# Altium footprint library 1.27插件排针.PcbLib: 49 footprints (part 1 of 4)
Each footprint in its own frame and in the unit in brackets; x right, y up, seen from the top. Pads: shape width x height; smd on the part's side, far side on the other; paste and mask are expansions set on the pad; w line width, h text height; cw(c..) or ccw(c..) is an arc to the next point about the centre after c.
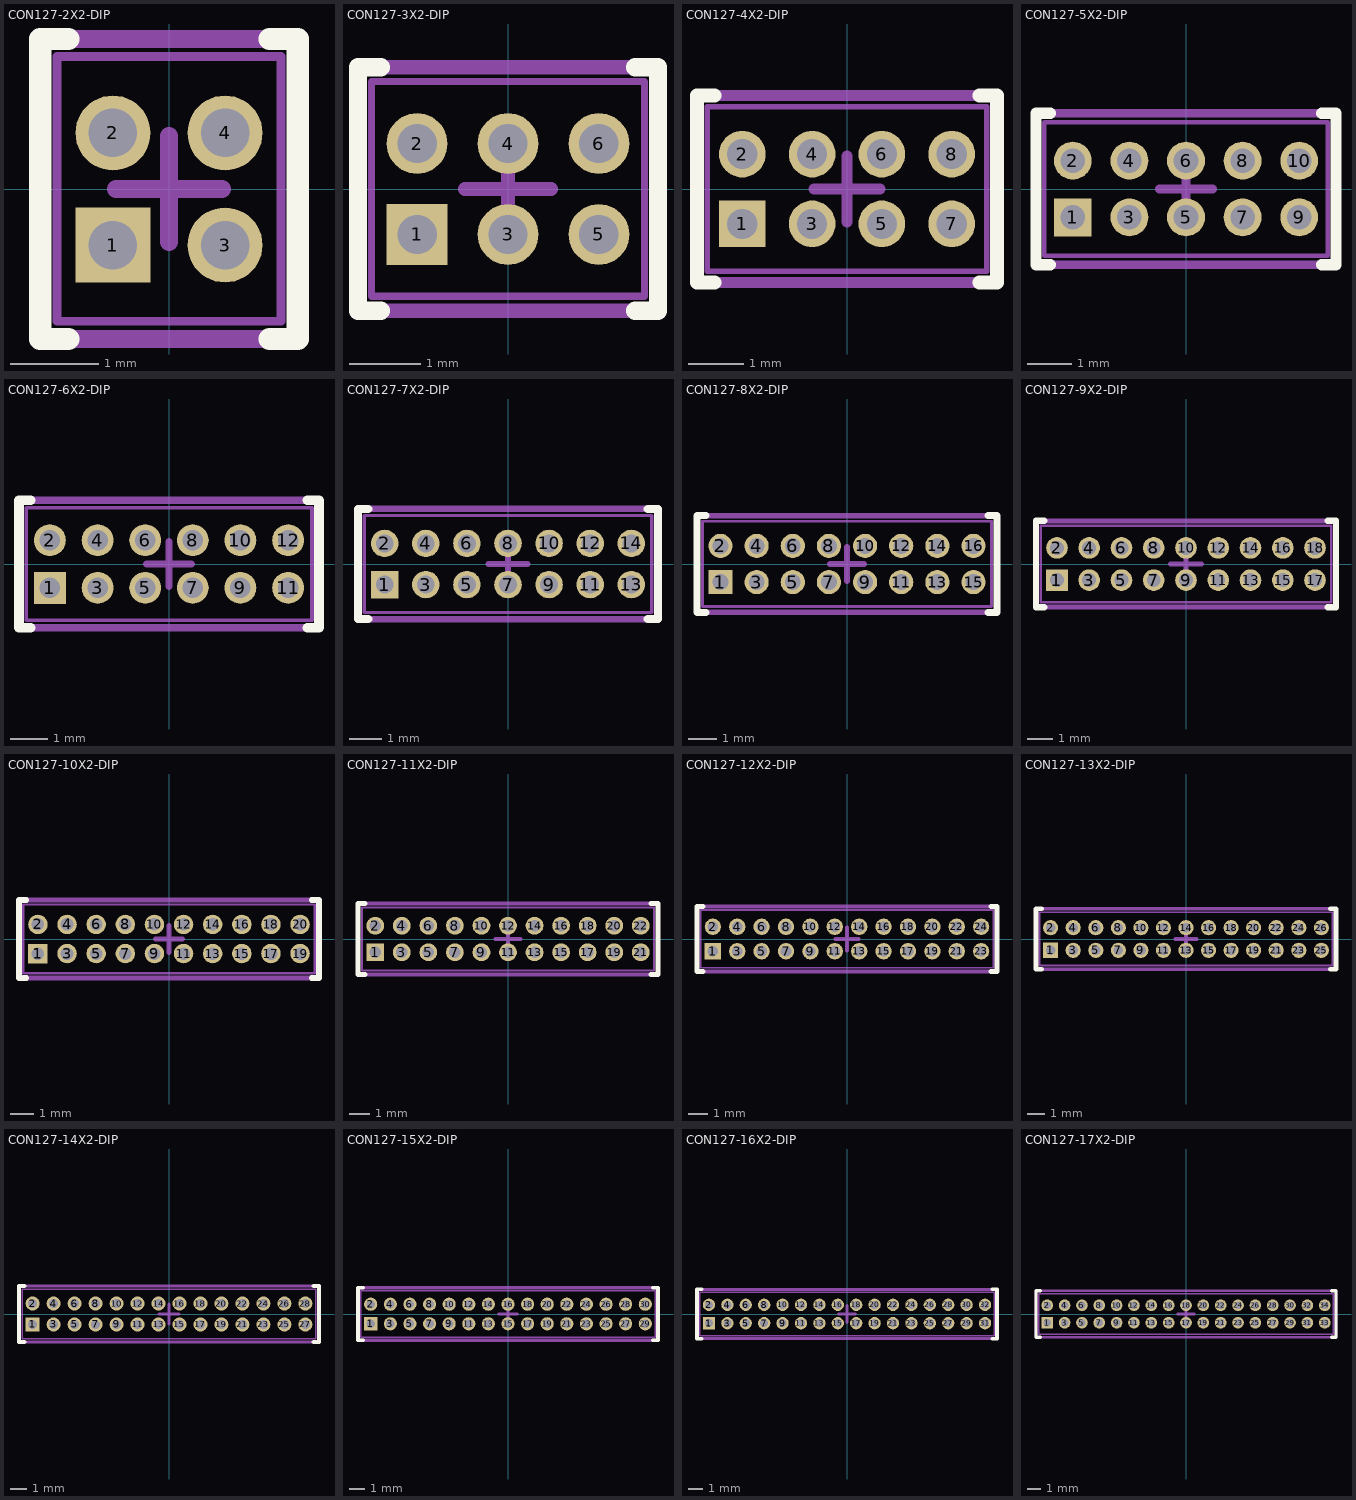
[diagram p0: the footprints below, top view; thin cyan lines are the x and y axes]

## CON127-2X2-DIP [mm] "1.27mm脚距2*2 双排针 -55°C to+105°C 450V AC"
height 3.5
pads (4):
  rect 0.85x0.85 hole 0.55 unplated: 1(-0.635,-0.635)
  round 0.85 hole 0.55 unplated: 2(-0.635,0.635) 3(0.635,-0.635) 4(0.635,0.635)
Top Overlay:
  lines w0.254: -1.143,-1.7 -1.46,-1.7 -1.46,1.7 -1.143,1.7 ; 1.143,-1.7 1.46,-1.7 1.46,1.7 1.143,1.7
Mechanical 13:
  lines w0.1: -1.27,-1.499 -1.27,1.501 ; -1.27,-1.499 1.27,-1.499 ; -1.27,-1.499 -1.27,1.501 ; -1.27,1.501 1.27,1.501 ; 1.27,-1.499 1.27,1.501 ; 1.27,-1.499 1.27,1.501
Mechanical 15:
  lines w0.2: -0.6,0 0.6,0 ; 0,-0.6 0,0.6 ; -1.46,-1.7 -1.46,1.7 1.46,1.7 1.46,-1.7 -1.46,-1.7
3D body: height 3.8, standoff -1.8, extent -1.27,-1.499 1.27,1.501

## CON127-3X2-DIP [mm] "1.27mm脚距3*2 双排针 -55°C to+105°C 450V AC"
height 3.5
pads (6):
  rect 0.85x0.85 hole 0.55 unplated: 1(-1.27,-0.635)
  round 0.85 hole 0.55 unplated: 2(-1.27,0.635) 3(0,-0.635) 4(0,0.635) 5(1.27,-0.635) 6(1.27,0.635)
Top Overlay:
  lines w0.254: -1.778,-1.7 -2.095,-1.7 -2.095,1.7 -1.778,1.7 ; 1.778,-1.7 2.095,-1.7 2.095,1.7 1.778,1.7
Mechanical 13:
  lines w0.1: -1.905,-1.499 -1.905,1.501 ; -1.905,-1.499 1.905,-1.499 ; -1.905,-1.499 -1.905,1.501 ; -1.905,1.501 1.905,1.501 ; 1.905,-1.499 1.905,1.501 ; 1.905,-1.499 1.905,1.501
Mechanical 15:
  lines w0.2: -0.6,0 0.6,0 ; 0,-0.6 0,0.6 ; -2.095,-1.7 2.095,-1.7 2.095,1.7 -2.095,1.7 -2.095,-1.7
3D body: height 3.8, standoff -1.8, extent -1.905,-1.499 1.905,1.501

## CON127-4X2-DIP [mm] "1.27mm脚距4*2 双排针 -55°C to+105°C 450V AC"
height 3.5
pads (8):
  rect 0.85x0.85 hole 0.55 unplated: 1(-1.905,-0.635)
  round 0.85 hole 0.55 unplated: 2(-1.905,0.635) 3(-0.635,-0.635) 4(-0.635,0.635) 5(0.635,-0.635) 6(0.635,0.635) 7(1.905,-0.635) 8(1.905,0.635)
Top Overlay:
  lines w0.254: -2.413,-1.7 -2.73,-1.7 -2.73,1.7 -2.413,1.7 ; 2.413,-1.7 2.73,-1.7 2.73,1.7 2.413,1.7
Mechanical 13:
  lines w0.1: -2.54,-1.499 -2.54,1.501 ; -2.54,-1.499 2.54,-1.499 ; -2.54,-1.499 -2.54,1.501 ; -2.54,1.501 2.54,1.501 ; 2.54,-1.499 2.54,1.501 ; 2.54,-1.499 2.54,1.501
Mechanical 15:
  lines w0.2: -0.6,0 0.6,0 ; 0,-0.6 0,0.6 ; -2.73,-1.7 2.73,-1.7 2.73,1.7 -2.73,1.7 -2.73,-1.7
3D body: height 3.8, standoff -1.8, extent -2.54,-1.499 2.54,1.501

## CON127-5X2-DIP [mm] "1.27mm脚距5*2 双排针 -55°C to+105°C 450V AC"
height 3.5
pads (10):
  rect 0.85x0.85 hole 0.55 unplated: 1(-2.54,-0.635)
  round 0.85 hole 0.55 unplated: 2(-2.54,0.635) 3(-1.27,-0.635) 4(-1.27,0.635) 5(0,-0.635) 6(0,0.635) 7(1.27,-0.635) 8(1.27,0.635) 9(2.54,-0.635) 10(2.54,0.635)
Top Overlay:
  lines w0.254: -3.048,-1.7 -3.365,-1.7 -3.365,1.7 -3.048,1.7 ; 3.048,-1.7 3.365,-1.7 3.365,1.7 3.048,1.7
Mechanical 13:
  lines w0.1: -3.175,-1.499 -3.175,1.501 ; -3.175,-1.499 3.175,-1.499 ; -3.175,-1.499 -3.175,1.501 ; -3.175,1.501 3.175,1.501 ; 3.175,-1.499 3.175,1.501 ; 3.175,-1.499 3.175,1.501
Mechanical 15:
  lines w0.2: -0.6,0 0.6,0 ; 0,-0.6 0,0.6 ; -3.365,-1.7 -3.365,1.7 3.365,1.7 3.365,-1.7 -3.365,-1.7
3D body: height 3.8, standoff -1.8, extent -3.175,-1.499 3.175,1.501

## CON127-6X2-DIP [mm] "1.27mm脚距6*2 双排针 -55°C to+105°C 450V AC"
height 3.5
pads (12):
  rect 0.85x0.85 hole 0.55 unplated: 1(-3.175,-0.635)
  round 0.85 hole 0.55 unplated: 2(-3.175,0.635) 3(-1.905,-0.635) 4(-1.905,0.635) 5(-0.635,-0.635) 6(-0.635,0.635) 7(0.635,-0.635) 8(0.635,0.635) 9(1.905,-0.635) 10(1.905,0.635) 11(3.175,-0.635) 12(3.175,0.635)
Top Overlay:
  lines w0.254: -3.683,-1.7 -4,-1.7 -4,1.7 -3.683,1.7 ; 3.683,-1.7 4,-1.7 4,1.7 3.683,1.7
Mechanical 13:
  lines w0.1: -3.81,-1.499 -3.81,1.501 ; -3.81,-1.499 3.81,-1.499 ; -3.81,-1.499 -3.81,1.501 ; -3.81,1.501 3.81,1.501 ; 3.81,-1.499 3.81,1.501 ; 3.81,-1.499 3.81,1.501
Mechanical 15:
  lines w0.2: -0.6,0 0.6,0 ; 0,-0.6 0,0.6 ; -4,-1.7 -4,1.7 4,1.7 4,-1.7 -4,-1.7
3D body: height 3.8, standoff -1.8, extent -3.81,-1.499 3.81,1.501

## CON127-7X2-DIP [mm] "1.27mm脚距7*2 双排针 -55°C to+105°C 450V AC"
height 3.5
pads (14):
  rect 0.85x0.85 hole 0.55 unplated: 1(-3.81,-0.635)
  round 0.85 hole 0.55 unplated: 2(-3.81,0.635) 3(-2.54,-0.635) 4(-2.54,0.635) 5(-1.27,-0.635) 6(-1.27,0.635) 7(0,-0.635) 8(0,0.635) 9(1.27,-0.635) 10(1.27,0.635) 11(2.54,-0.635) 12(2.54,0.635) 13(3.81,-0.635) 14(3.81,0.635)
Top Overlay:
  lines w0.254: -4.318,-1.7 -4.635,-1.7 -4.635,1.7 -4.318,1.7 ; 4.318,-1.7 4.635,-1.7 4.635,1.7 4.318,1.7
Mechanical 13:
  lines w0.1: -4.445,-1.499 -4.445,1.501 ; -4.445,-1.499 4.445,-1.499 ; -4.445,-1.499 -4.445,1.501 ; -4.445,1.501 4.445,1.501 ; 4.445,-1.499 4.445,1.501 ; 4.445,-1.499 4.445,1.501
Mechanical 15:
  lines w0.2: -0.6,0 0.6,0 ; 0,-0.6 0,0.6 ; -4.635,-1.7 -4.635,1.7 4.635,1.7 4.635,-1.7 -4.635,-1.7
3D body: height 3.8, standoff -1.8, extent -4.445,-1.499 4.445,1.501

## CON127-8X2-DIP [mm] "1.27mm脚距8*2 双排针 -55°C to+105°C 450V AC"
height 5
pads (16):
  rect 0.85x0.85 hole 0.55 unplated: 1(-4.445,-0.635)
  round 0.85 hole 0.55 unplated: 2(-4.445,0.635) 3(-3.175,-0.635) 4(-3.175,0.635) 5(-1.905,-0.635) 6(-1.905,0.635) 7(-0.635,-0.635) 8(-0.635,0.635) 9(0.635,-0.635) 10(0.635,0.635) 11(1.905,-0.635) 12(1.905,0.635) 13(3.175,-0.635) 14(3.175,0.635) 15(4.445,-0.635) 16(4.445,0.635)
Top Overlay:
  lines w0.254: -4.953,-1.7 -5.27,-1.7 -5.27,1.7 -4.953,1.7 ; 4.953,-1.7 5.27,-1.7 5.27,1.7 4.953,1.7
Mechanical 13:
  lines w0.1: -5.08,-1.499 -5.08,1.501 ; -5.08,-1.499 5.08,-1.499 ; -5.08,-1.499 -5.08,1.501 ; -5.08,1.501 5.08,1.501 ; 5.08,-1.499 5.08,1.501 ; 5.08,-1.499 5.08,1.501
Mechanical 15:
  lines w0.2: -0.6,0 0.6,0 ; 0,-0.6 0,0.6 ; -5.27,-1.7 5.27,-1.7 5.27,1.7 -5.27,1.7 -5.27,-1.7
3D body: height 3.8, standoff -1.8, extent -5.08,-1.499 5.08,1.501

## CON127-9X2-DIP [mm] "1.27mm脚距9*2 双排针 -55°C to+105°C 450V AC"
height 5
pads (18):
  rect 0.85x0.85 hole 0.55 unplated: 1(-5.08,-0.635)
  round 0.85 hole 0.55 unplated: 2(-5.08,0.635) 3(-3.81,-0.635) 4(-3.81,0.635) 5(-2.54,-0.635) 6(-2.54,0.635) 7(-1.27,-0.635) 8(-1.27,0.635) 9(0,-0.635) 10(0,0.635) 11(1.27,-0.635) 12(1.27,0.635) 13(2.54,-0.635) 14(2.54,0.635) 15(3.81,-0.635) 16(3.81,0.635) 17(5.08,-0.635) 18(5.08,0.635)
Top Overlay:
  lines w0.254: -5.588,-1.7 -5.905,-1.7 -5.905,1.7 -5.588,1.7 ; 5.588,-1.7 5.905,-1.7 5.905,1.7 5.588,1.7
Mechanical 13:
  lines w0.1: -5.715,-1.499 -5.715,1.501 ; -5.715,-1.499 5.715,-1.499 ; -5.715,-1.499 -5.715,1.501 ; -5.715,1.501 5.715,1.501 ; 5.715,-1.499 5.715,1.501 ; 5.715,-1.499 5.715,1.501
Mechanical 15:
  lines w0.2: -0.6,0 0.6,0 ; 0,-0.6 0,0.6 ; -5.905,-1.7 5.905,-1.7 5.905,1.7 -5.905,1.7 -5.905,-1.7
3D body: height 3.8, standoff -1.8, extent -5.715,-1.499 5.715,1.501

## CON127-10X2-DIP [mm] "1.27mm脚距10*2 双排针 -55°C to+105°C 450V AC"
height 3.5
pads (20):
  rect 0.85x0.85 hole 0.55 unplated: 1(-5.715,-0.635)
  round 0.85 hole 0.55 unplated: 2(-5.715,0.635) 3(-4.445,-0.635) 4(-4.445,0.635) 5(-3.175,-0.635) 6(-3.175,0.635) 7(-1.905,-0.635) 8(-1.905,0.635) 9(-0.635,-0.635) 10(-0.635,0.635) 11(0.635,-0.635) 12(0.635,0.635) 13(1.905,-0.635) 14(1.905,0.635) 15(3.175,-0.635) 16(3.175,0.635) 17(4.445,-0.635) 18(4.445,0.635) 19(5.715,-0.635) 20(5.715,0.635)
Top Overlay:
  lines w0.254: -6.223,-1.7 -6.54,-1.7 -6.54,1.7 -6.223,1.7 ; 6.223,-1.7 6.54,-1.7 6.54,1.7 6.223,1.7
Mechanical 13:
  lines w0.1: -6.35,-1.499 -6.35,1.501 ; -6.35,-1.499 6.35,-1.499 ; -6.35,-1.499 -6.35,1.501 ; -6.35,1.501 6.35,1.501 ; 6.35,-1.499 6.35,1.501 ; 6.35,-1.499 6.35,1.501
Mechanical 15:
  lines w0.2: -0.6,0 0.6,0 ; 0,-0.6 0,0.6 ; -6.54,-1.7 6.54,-1.7 6.54,1.7 -6.54,1.7 -6.54,-1.7
3D body: height 3.8, standoff -1.8, extent -6.35,-1.499 6.35,1.501

## CON127-11X2-DIP [mm] "1.27mm脚距11*2 双排针 -55°C to+105°C 450V AC"
height 3.5
pads (22):
  rect 0.85x0.85 hole 0.55 unplated: 1(-6.35,-0.635)
  round 0.85 hole 0.55 unplated: 2(-6.35,0.635) 3(-5.08,-0.635) 4(-5.08,0.635) 5(-3.81,-0.635) 6(-3.81,0.635) 7(-2.54,-0.635) 8(-2.54,0.635) 9(-1.27,-0.635) 10(-1.27,0.635) 11(0,-0.635) 12(0,0.635) 13(1.27,-0.635) 14(1.27,0.635) 15(2.54,-0.635) 16(2.54,0.635) 17(3.81,-0.635) 18(3.81,0.635) 19(5.08,-0.635) 20(5.08,0.635) 21(6.35,-0.635) 22(6.35,0.635)
Top Overlay:
  lines w0.254: -6.858,-1.7 -7.175,-1.7 -7.175,1.7 -6.858,1.7 ; 6.858,-1.7 7.175,-1.7 7.175,1.7 6.858,1.7
Mechanical 13:
  lines w0.1: -6.985,-1.499 -6.985,1.501 ; -6.985,-1.499 6.985,-1.499 ; -6.985,-1.499 -6.985,1.501 ; -6.985,1.501 6.985,1.501 ; 6.985,-1.499 6.985,1.501 ; 6.985,-1.499 6.985,1.501
Mechanical 15:
  lines w0.2: -0.6,0 0.6,0 ; 0,-0.6 0,0.6 ; -7.175,-1.7 7.175,-1.7 7.175,1.7 -7.175,1.7 -7.175,-1.7
3D body: height 3.8, standoff -1.8, extent -6.985,-1.499 6.985,1.501

## CON127-12X2-DIP [mm] "1.27mm脚距12*2 双排针 -55°C to+105°C 450V AC"
height 3.5
pads (24):
  rect 0.85x0.85 hole 0.55 unplated: 1(-6.985,-0.635)
  round 0.85 hole 0.55 unplated: 2(-6.985,0.635) 3(-5.715,-0.635) 4(-5.715,0.635) 5(-4.445,-0.635) 6(-4.445,0.635) 7(-3.175,-0.635) 8(-3.175,0.635) 9(-1.905,-0.635) 10(-1.905,0.635) 11(-0.635,-0.635) 12(-0.635,0.635) 13(0.635,-0.635) 14(0.635,0.635) 15(1.905,-0.635) 16(1.905,0.635) 17(3.175,-0.635) 18(3.175,0.635) 19(4.445,-0.635) 20(4.445,0.635) 21(5.715,-0.635) 22(5.715,0.635) 23(6.985,-0.635) 24(6.985,0.635)
Top Overlay:
  lines w0.254: -7.493,-1.7 -7.81,-1.7 -7.81,1.7 -7.493,1.7 ; 7.493,-1.7 7.81,-1.7 7.81,1.7 7.493,1.7
Mechanical 13:
  lines w0.1: -7.62,-1.499 -7.62,1.501 ; -7.62,-1.499 7.62,-1.499 ; -7.62,-1.499 -7.62,1.501 ; -7.62,1.501 7.62,1.501 ; 7.62,-1.499 7.62,1.501 ; 7.62,-1.499 7.62,1.501
Mechanical 15:
  lines w0.2: -0.6,0 0.6,0 ; 0,-0.6 0,0.6 ; -7.81,-1.7 7.81,-1.7 7.81,1.7 -7.81,1.7 -7.81,-1.7
3D body: height 3.8, standoff -1.8, extent -7.62,-1.499 7.62,1.501

## CON127-13X2-DIP [mm] "1.27mm脚距13*2 双排针 -55°C to+105°C 450V AC"
height 3.5
pads (26):
  rect 0.85x0.85 hole 0.55 unplated: 1(-7.62,-0.635)
  round 0.85 hole 0.55 unplated: 2(-7.62,0.635) 3(-6.35,-0.635) 4(-6.35,0.635) 5(-5.08,-0.635) 6(-5.08,0.635) 7(-3.81,-0.635) 8(-3.81,0.635) 9(-2.54,-0.635) 10(-2.54,0.635) 11(-1.27,-0.635) 12(-1.27,0.635) 13(0,-0.635) 14(0,0.635) 15(1.27,-0.635) 16(1.27,0.635) 17(2.54,-0.635) 18(2.54,0.635) 19(3.81,-0.635) 20(3.81,0.635) 21(5.08,-0.635) 22(5.08,0.635) 23(6.35,-0.635) 24(6.35,0.635) 25(7.62,-0.635) 26(7.62,0.635)
Top Overlay:
  lines w0.254: -8.128,-1.7 -8.445,-1.7 -8.445,1.7 -8.128,1.7 ; 8.128,-1.7 8.445,-1.7 8.445,1.7 8.128,1.7
Mechanical 13:
  lines w0.1: -8.255,-1.499 -8.255,1.501 ; -8.255,-1.499 8.255,-1.499 ; -8.255,-1.499 -8.255,1.501 ; -8.255,1.501 8.255,1.501 ; 8.255,-1.499 8.255,1.501 ; 8.255,-1.499 8.255,1.501
Mechanical 15:
  lines w0.2: -0.6,0 0.6,0 ; 0,-0.6 0,0.6 ; -8.445,-1.7 8.445,-1.7 8.445,1.7 -8.445,1.7 -8.445,-1.7
3D body: height 3.8, standoff -1.8, extent -8.255,-1.499 8.255,1.501

## CON127-14X2-DIP [mm] "1.27mm脚距14*2 双排针 -55°C to+105°C 450V AC"
height 3.5
pads (28):
  rect 0.85x0.85 hole 0.55 unplated: 1(-8.255,-0.635)
  round 0.85 hole 0.55 unplated: 2(-8.255,0.635) 3(-6.985,-0.635) 4(-6.985,0.635) 5(-5.715,-0.635) 6(-5.715,0.635) 7(-4.445,-0.635) 8(-4.445,0.635) 9(-3.175,-0.635) 10(-3.175,0.635) 11(-1.905,-0.635) 12(-1.905,0.635) 13(-0.635,-0.635) 14(-0.635,0.635) 15(0.635,-0.635) 16(0.635,0.635) 17(1.905,-0.635) 18(1.905,0.635) 19(3.175,-0.635) 20(3.175,0.635) 21(4.445,-0.635) 22(4.445,0.635) 23(5.715,-0.635) 24(5.715,0.635) 25(6.985,-0.635) 26(6.985,0.635) 27(8.255,-0.635) 28(8.255,0.635)
Top Overlay:
  lines w0.254: -8.763,-1.7 -9.08,-1.7 -9.08,1.7 -8.763,1.7 ; 8.763,-1.7 9.08,-1.7 9.08,1.7 8.763,1.7
Mechanical 13:
  lines w0.1: -8.89,-1.499 -8.89,1.501 ; -8.89,-1.499 8.89,-1.499 ; -8.89,-1.499 -8.89,1.501 ; -8.89,1.501 8.89,1.501 ; 8.89,-1.499 8.89,1.501 ; 8.89,-1.499 8.89,1.501
Mechanical 15:
  lines w0.2: -0.6,0 0.6,0 ; 0,-0.6 0,0.6 ; -9.08,-1.7 9.08,-1.7 9.08,1.7 -9.08,1.7 -9.08,-1.7
3D body: height 3.8, standoff -1.8, extent -8.89,-1.499 8.89,1.501

## CON127-15X2-DIP [mm] "1.27mm脚距15*2 双排针 -55°C to+105°C 450V AC"
height 3.5
pads (30):
  rect 0.85x0.85 hole 0.55 unplated: 1(-8.89,-0.635)
  round 0.85 hole 0.55 unplated: 2(-8.89,0.635) 3(-7.62,-0.635) 4(-7.62,0.635) 5(-6.35,-0.635) 6(-6.35,0.635) 7(-5.08,-0.635) 8(-5.08,0.635) 9(-3.81,-0.635) 10(-3.81,0.635) 11(-2.54,-0.635) 12(-2.54,0.635) 13(-1.27,-0.635) 14(-1.27,0.635) 15(0,-0.635) 16(0,0.635) 17(1.27,-0.635) 18(1.27,0.635) 19(2.54,-0.635) 20(2.54,0.635) 21(3.81,-0.635) 22(3.81,0.635) 23(5.08,-0.635) 24(5.08,0.635) 25(6.35,-0.635) 26(6.35,0.635) 27(7.62,-0.635) 28(7.62,0.635) 29(8.89,-0.635) 30(8.89,0.635)
Top Overlay:
  lines w0.254: -9.398,-1.7 -9.715,-1.7 -9.715,1.7 -9.398,1.7 ; 9.398,-1.7 9.715,-1.7 9.715,1.7 9.398,1.7
Mechanical 13:
  lines w0.1: -9.525,-1.499 -9.525,1.501 ; -9.525,-1.499 9.525,-1.499 ; -9.525,-1.499 -9.525,1.501 ; -9.525,1.501 9.525,1.501 ; 9.525,-1.499 9.525,1.501 ; 9.525,-1.499 9.525,1.501
Mechanical 15:
  lines w0.2: -0.6,0 0.6,0 ; 0,-0.6 0,0.6 ; -9.715,-1.7 -9.715,1.7 9.715,1.7 9.715,-1.7 -9.715,-1.7
3D body: height 3.8, standoff -1.8, extent -9.525,-1.499 9.525,1.501

## CON127-16X2-DIP [mm] "1.27mm脚距16*2 双排针 -55°C to+105°C 450V AC"
height 3.5
pads (32):
  rect 0.85x0.85 hole 0.55 unplated: 1(-9.525,-0.635)
  round 0.85 hole 0.55 unplated: 2(-9.525,0.635) 3(-8.255,-0.635) 4(-8.255,0.635) 5(-6.985,-0.635) 6(-6.985,0.635) 7(-5.715,-0.635) 8(-5.715,0.635) 9(-4.445,-0.635) 10(-4.445,0.635) 11(-3.175,-0.635) 12(-3.175,0.635) 13(-1.905,-0.635) 14(-1.905,0.635) 15(-0.635,-0.635) 16(-0.635,0.635) 17(0.635,-0.635) 18(0.635,0.635) 19(1.905,-0.635) 20(1.905,0.635) 21(3.175,-0.635) 22(3.175,0.635) 23(4.445,-0.635) 24(4.445,0.635) 25(5.715,-0.635) 26(5.715,0.635) 27(6.985,-0.635) 28(6.985,0.635) 29(8.255,-0.635) 30(8.255,0.635) 31(9.525,-0.635) 32(9.525,0.635)
Top Overlay:
  lines w0.254: -10.033,-1.7 -10.35,-1.7 -10.35,1.7 -10.033,1.7 ; 10.033,-1.7 10.35,-1.7 10.35,1.7 10.033,1.7
Mechanical 13:
  lines w0.1: -10.16,-1.499 -10.16,1.501 ; -10.16,-1.499 10.16,-1.499 ; -10.16,-1.499 -10.16,1.501 ; -10.16,1.501 10.16,1.501 ; 10.16,-1.499 10.16,1.501 ; 10.16,-1.499 10.16,1.501
Mechanical 15:
  lines w0.2: -0.6,0 0.6,0 ; 0,-0.6 0,0.6 ; -10.35,-1.7 -10.35,1.7 10.35,1.7 10.35,-1.7 -10.35,-1.7
3D body: height 3.8, standoff -1.8, extent -10.16,-1.499 10.16,1.501

## CON127-17X2-DIP [mm] "1.27mm脚距17*2 双排针 -55°C to+105°C 450V AC"
height 3.5
pads (34):
  rect 0.85x0.85 hole 0.55 unplated: 1(-10.16,-0.635)
  round 0.85 hole 0.55 unplated: 2(-10.16,0.635) 3(-8.89,-0.635) 4(-8.89,0.635) 5(-7.62,-0.635) 6(-7.62,0.635) 7(-6.35,-0.635) 8(-6.35,0.635) 9(-5.08,-0.635) 10(-5.08,0.635) 11(-3.81,-0.635) 12(-3.81,0.635) 13(-2.54,-0.635) 14(-2.54,0.635) 15(-1.27,-0.635) 16(-1.27,0.635) 17(0,-0.635) 18(0,0.635) 19(1.27,-0.635) 20(1.27,0.635) 21(2.54,-0.635) 22(2.54,0.635) 23(3.81,-0.635) 24(3.81,0.635) 25(5.08,-0.635) 26(5.08,0.635) 27(6.35,-0.635) 28(6.35,0.635) 29(7.62,-0.635) 30(7.62,0.635) 31(8.89,-0.635) 32(8.89,0.635) 33(10.16,-0.635) 34(10.16,0.635)
Top Overlay:
  lines w0.254: -10.668,-1.7 -10.985,-1.7 -10.985,1.7 -10.668,1.7 ; 10.668,-1.7 10.985,-1.7 10.985,1.7 10.668,1.7
Mechanical 13:
  lines w0.1: -10.795,-1.499 -10.795,1.501 ; -10.795,-1.499 10.795,-1.499 ; -10.795,-1.499 -10.795,1.501 ; -10.795,1.501 10.795,1.501 ; 10.795,-1.499 10.795,1.501 ; 10.795,-1.499 10.795,1.501
Mechanical 15:
  lines w0.2: -0.6,0 0.6,0 ; 0,-0.6 0,0.6 ; -10.985,-1.7 -10.985,1.7 10.985,1.7 10.985,-1.7 -10.985,-1.7
3D body: height 3.8, standoff -1.8, extent -10.795,-1.499 10.795,1.501